# Altium footprint library E17-04-PCB1.PcbLib: 39 footprints (part 2 of 3)
Each footprint in its own frame and in the unit in brackets; x right, y up, seen from the top. Pads: shape width x height; smd on the part's side, far side on the other; paste and mask are expansions set on the pad; w line width, h text height; cw(c..) or ccw(c..) is an arc to the next point about the centre after c.
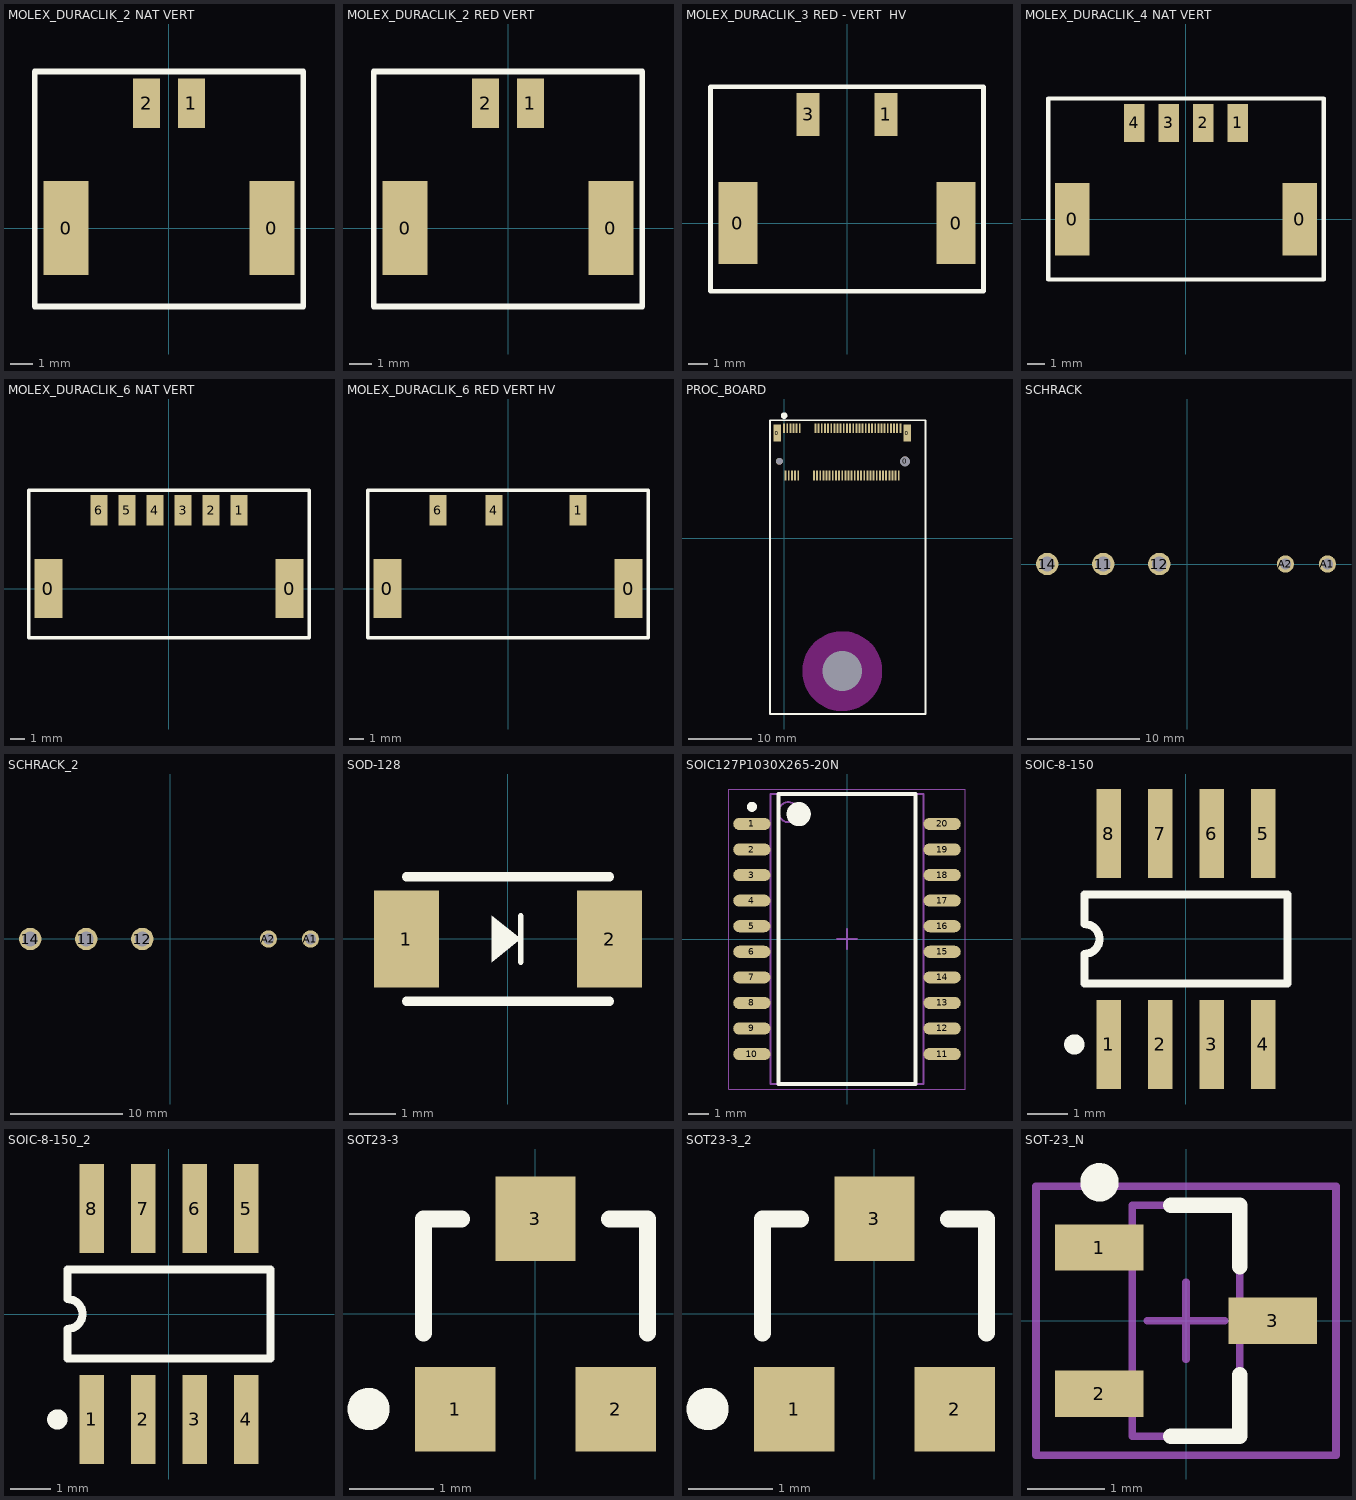
[diagram p1: the footprints below, top view; thin cyan lines are the x and y axes]

## MOLEX_DURACLIK_2 NAT VERT [mm] "2 Positions Header, Shrouded Connector 0.079\" (2.00mm) Surface Mount, Right Angle Tin"
pads (4):
  rect 2x4.2 smd: 0(-4.6,0) 0(4.6,0)
  rect 1.2x2.2 smd: 1(1,5.58) 2(-1,5.58)
Top Overlay:
  lines w0.254: -6,-3.5 6,-3.5 6,7 -6,7 -6,-3.5
3D body "5600200220.STEP": height 8, standoff 0, extent -5.45,-3 5.45,6.15

## MOLEX_DURACLIK_2 RED VERT [mm] "2 Positions Header, Shrouded Connector 0.079\" (2.00mm) Surface Mount, Right Angle Tin"
pads (4):
  rect 2x4.2 smd: 0(-4.6,0) 0(4.6,0)
  rect 1.2x2.2 smd: 1(1,5.58) 2(-1,5.58)
Top Overlay:
  lines w0.254: -6,-3.5 6,-3.5 6,7 -6,7 -6,-3.5
3D body "5600200222.STEP": height 8, standoff 0, extent -5.45,-3 5.45,6.15

## MOLEX_DURACLIK_3 RED - VERT  HV [mm] "2 Positions Header, Shrouded Connector 0.079\" (2.00mm) Surface Mount, Right Angle Tin"
pads (4):
  rect 2x4.2 smd: 0(-5.6,0) 0(5.6,0)
  rect 1.2x2.2 smd: 1(2,5.58) 3(-2,5.58)
Top Overlay:
  lines w0.254: -7,-3.5 -7,7 7,7 7,-3.5 -7,-3.5
3D body "5600200322.STEP": height 8, standoff 0, extent -6.3,-3 6.3,6.15

## MOLEX_DURACLIK_4 NAT VERT [mm] "2 Positions Header, Shrouded Connector 0.079\" (2.00mm) Surface Mount, Right Angle Tin"
pads (6):
  rect 2x4.2 smd: 0(-6.6,0) 0(6.6,0)
  rect 1.2x2.2 smd: 1(3,5.58) 2(1,5.58) 3(-1,5.58) 4(-3,5.58)
Top Overlay:
  lines w0.254: -8,-3.5 -8,7 8,7 8,-3.5 -8,-3.5
3D body "5600200420.STEP": height 8, standoff 0, extent -7.3,-3 7.3,6.15

## MOLEX_DURACLIK_6 NAT VERT [mm] "2 Positions Header, Shrouded Connector 0.079\" (2.00mm) Surface Mount, Right Angle Tin"
pads (8):
  rect 2x4.2 smd: 0(-8.6,0) 0(8.6,0)
  rect 1.2x2.2 smd: 1(5,5.58) 2(3,5.58) 3(1,5.58) 4(-1,5.58) 5(-3,5.58) 6(-5,5.58)
Top Overlay:
  lines w0.254: -10,-3.5 -10,7 10,7 10,-3.5 -10,-3.5
3D body "5600200620.STEP": height 8, standoff 0, extent -9.3,-3 9.3,6.15

## MOLEX_DURACLIK_6 RED VERT HV [mm] "2 Positions Header, Shrouded Connector 0.079\" (2.00mm) Surface Mount, Right Angle Tin"
pads (5):
  rect 2x4.2 smd: 0(-8.6,0) 0(8.6,0)
  rect 1.2x2.2 smd: 1(5,5.58) 4(-1,5.58) 6(-5,5.58)
Top Overlay:
  lines w0.254: -10,-3.5 -10,7 10,7 10,-3.5 -10,-3.5
3D body "5600200620.STEP": height 8, standoff 0, extent -9.3,-3 9.3,6.15

## PROC_BOARD [mm]
pads (72):
  rect 1.2x2.75 smd: 0(-1.1,16.725) 0(19.6,16.725)
  round 1.1 hole 1.1 unplated paste+0: 0(-0.75,12.225)
  round 0 hole 6.35 unplated: 0(9.258,-21.183)
  round 1.524 hole 1.6 unplated: 0(19.25,12.225)
  rect 0.3x1.55 smd: 1(0,17.5) 2(0.25,9.95) 3(0.5,17.5) 4(0.75,9.95) 5(1,17.5) 6(1.25,9.95) 7(1.5,17.5) 8(1.75,9.95) 9(2,17.5) 10(2.25,9.95) 11(2.5,17.5) 12(4.75,9.95) 13(5,17.5) 14(5.25,9.95) 15(5.5,17.5) 16(5.75,9.95) 17(6,17.5) 18(6.25,9.95) 19(6.5,17.5) 20(6.75,9.95) 21(7,17.5) 22(7.25,9.95) 23(7.5,17.5) 24(7.75,9.95) 25(8,17.5) 26(8.25,9.95) 27(8.5,17.5) 28(8.75,9.95) 29(9,17.5) 30(9.25,9.95) 31(9.5,17.5) 32(9.75,9.95) 33(10,17.5) 34(10.25,9.95) 35(10.5,17.5) 36(10.75,9.95) 37(11,17.5) 38(11.25,9.95) 39(11.5,17.5) 40(11.75,9.95) 41(12,17.5) 42(12.25,9.95) 43(12.5,17.5) 44(12.75,9.95) 45(13,17.5) 46(13.25,9.95) 47(13.5,17.5) 48(13.75,9.95) 49(14,17.5) 50(14.25,9.95) 51(14.5,17.5) 52(14.75,9.95) 53(15,17.5) 54(15.25,9.95) 55(15.5,17.5) 56(15.75,9.95) 57(16,17.5) 58(16.25,9.95) 59(16.5,17.5) 60(16.75,9.95) 61(17,17.5) 62(17.25,9.95) 63(17.5,17.5) 64(17.75,9.95) 65(18,17.5) 66(18.25,9.95) 67(18.5,17.5)
Top Overlay:
  circle w0.55: c0,19.5 r0.25
  lines w0.254: -2.25,-28 -2.25,18.75 22.5,18.75 22.5,-28 -2.25,-28
Keep-Out Layer:
  circle w6.35: c9.258,-21.183 r3.175
3D body "proc board2.stp": height 6.34, standoff -3.06, extent -1.698,-25.441 21.888,18.075

## SCHRACK [mm] "Slimline PCB Relay SNR"
pads (5):
  round 2 hole 1.3: 11(-7.5,0) 12(-2.5,0) 14(-12.5,0)
  round 1.524 hole 1: A1(12.5,0) A2(8.75,0)
3D body "c-1-1393236-3-b-3d.stp": height 15.01, standoff -3.49, extent -14.507,-1.195 13.493,3.805

## SCHRACK_2 [mm]
pads (5):
  round 2 hole 1.3: 11(-7.5,0) 12(-2.5,0) 14(-12.5,0)
  round 1.524 hole 1: A1(12.5,0) A2(8.75,0)
3D body "c-1-1393236-3-b-3d.stp": height 15.01, standoff -3.49, extent -14.507,-1.195 13.493,3.805

## SOD-128 [mm]
pads (2):
  rect 1.4x2.1 smd mask+0.076: 1(-2.2,0) 2(2.2,0)
Top Overlay:
  region: 0.275,0 -0.35,0.5 -0.35,-0.5
  lines w0.127: 0.275,-0.5 0.275,0.5
  lines w0.203: -2.2,-1.35 2.2,-1.35 ; -2.2,1.35 2.2,1.35
3D body "User Library-SOD128.STEP": height 1.1, standoff -0.01, extent -2.5,-1.35 2.5,1.35

## SOIC127P1030X265-20N [mm] "SOIC, 20-Leads, Body 14.80x7.50mm, Pitch 1.27mm, IPC Medium Density"
height 2.65
pads (20):
  oval 1.85x0.6 smd: 1(-4.725,5.715) 2(-4.725,4.445) 3(-4.725,3.175) 4(-4.725,1.905) 5(-4.725,0.635) 6(-4.725,-0.635) 7(-4.725,-1.905) 8(-4.725,-3.175) 9(-4.725,-4.445) 10(-4.725,-5.715) 11(4.725,-5.715) 12(4.725,-4.445) 13(4.725,-3.175) 14(4.725,-1.905) 15(4.725,-0.635) 16(4.725,0.635) 17(4.725,1.905) 18(4.725,3.175) 19(4.725,4.445) 20(4.725,5.715)
Top Overlay:
  circle w0.25: c-4.725,6.565 r0.125
  circle w0.6: c-2.4,6.2 r0.3
  lines w0.2: -3.4,-7.2 3.4,-7.2 3.4,7.2 -3.4,7.2 -3.4,-7.2
Mechanical 13:
  circle w0.1: c-2.9,6.3 r0.5
  lines w0.1: -3.8,-7.2 3.8,-7.2 3.8,7.2 -3.8,7.2 -3.8,-7.2
Mechanical 15:
  lines w0.05: -5.875,-7.45 5.875,-7.45 5.875,7.45 -5.875,7.45 -5.875,-7.45
  lines w0.1: -0.5,0 0.5,0 ; 0,-0.5 0,0.5
3D body: height 2.65, standoff 0.15, extent -3.8,-7.2 3.8,7.2

## SOIC-8-150 [mm] "SOIC-8 150 mil package"
pads (8):
  rect 0.6x2.2 smd: 1(-1.905,-2.6) 2(-0.635,-2.6) 3(0.635,-2.6) 4(1.905,-2.6) 5(1.905,2.6) 6(0.635,2.6) 7(-0.635,2.6) 8(-1.905,2.6)
Top Overlay:
  circle w0.25: c-2.755,-2.6 r0.125
  lines w0.2: -2.5,-1.1 2.5,-1.1 2.5,1.1 -2.5,1.1 -2.5,0.367 cw(c-2.5,0) -2.5,-0.367 -2.5,-1.1
3D body "User Library-SOIC-8-150.STEP": height 1.72, standoff -0.03, extent -2.525,-3.124 2.475,3.076

## SOIC-8-150_2 [mm]
pads (8):
  rect 0.6x2.2 smd: 1(-1.905,-2.6) 2(-0.635,-2.6) 3(0.635,-2.6) 4(1.905,-2.6) 5(1.905,2.6) 6(0.635,2.6) 7(-0.635,2.6) 8(-1.905,2.6)
Top Overlay:
  circle w0.25: c-2.755,-2.6 r0.125
  lines w0.2: -2.5,-1.1 2.5,-1.1 2.5,1.1 -2.5,1.1 -2.5,0.367 cw(c-2.5,0) -2.5,-0.367 -2.5,-1.1
3D body "User Library-SOIC-8-150.STEP": height 1.72, standoff -0.03, extent -2.525,-3.124 2.475,3.076

## SOT23-3 [mm] "SOT-23; 3 Leads; Body 3.0 x 2.5 mm, inc. leads (LxW max)"
height 1.17
pads (3):
  rect 0.95x1 smd: 1(-0.95,-1.125) 2(0.95,-1.125) 3(0,1.125)
Top Overlay:
  circle w0.25: c-1.975,-1.125 r0.125
  lines w0.2: -1.328,1.125 -0.875,1.125 ; -1.325,-0.225 -1.325,1.125 ; 0.875,1.125 1.325,1.125 1.325,-0.225
3D body "SOT23-3.STEP": height 1.17, standoff 0, extent -1.52,-1.24 1.52,1.24

## SOT23-3_2 [mm]
pads (3):
  rect 0.95x1 smd: 1(-0.95,-1.125) 2(0.95,-1.125) 3(0,1.125)
Top Overlay:
  circle w0.25: c-1.975,-1.125 r0.125
  lines w0.2: -1.328,1.125 -0.875,1.125 ; -1.325,-0.225 -1.325,1.125 ; 0.875,1.125 1.325,1.125 1.325,-0.225
3D body "SOT23-3.STEP": height 1.17, standoff 0, extent -1.52,-1.24 1.52,1.24

## SOT-23_N [mm] "SOT23, 3-Leads, Body 2.9x1.3mm, Pitch 0.95mm, Lead Span 2.5mm, IPC Medium Density"
height 1.1
pads (3):
  rect 1.15x0.6 smd: 1(-1.125,0.95) 2(-1.125,-0.95) 3(1.125,0)
Top Overlay:
  circle w0.25: c-1.125,1.8 r0.125
  lines w0.2: -0.2,-1.5 0.7,-1.5 0.7,-0.7 ; -0.2,1.5 0.7,1.5 0.7,0.7
Mechanical 13:
  lines w0.1: -0.7,-1.5 -0.7,1.5 0.7,1.5 0.7,-1.5 -0.7,-1.5
Mechanical 15:
  lines w0.1: -0.5,0 0.5,0 ; 0,-0.5 0,0.5 ; -1.95,-1.75 -1.95,1.75 1.95,1.75 1.95,-1.75 -1.95,-1.75
3D body: height 1.1, standoff 0, extent -0.7,-1.5 0.7,1.5